# Altium footprint library 28Pins_Project_V1I1.PcbLib: 30 footprints (part 1 of 2)
Each footprint in its own frame and in the unit in brackets; x right, y up, seen from the top. Pads: shape width x height; smd on the part's side, far side on the other; paste and mask are expansions set on the pad; w line width, h text height; cw(c..) or ccw(c..) is an arc to the next point about the centre after c.
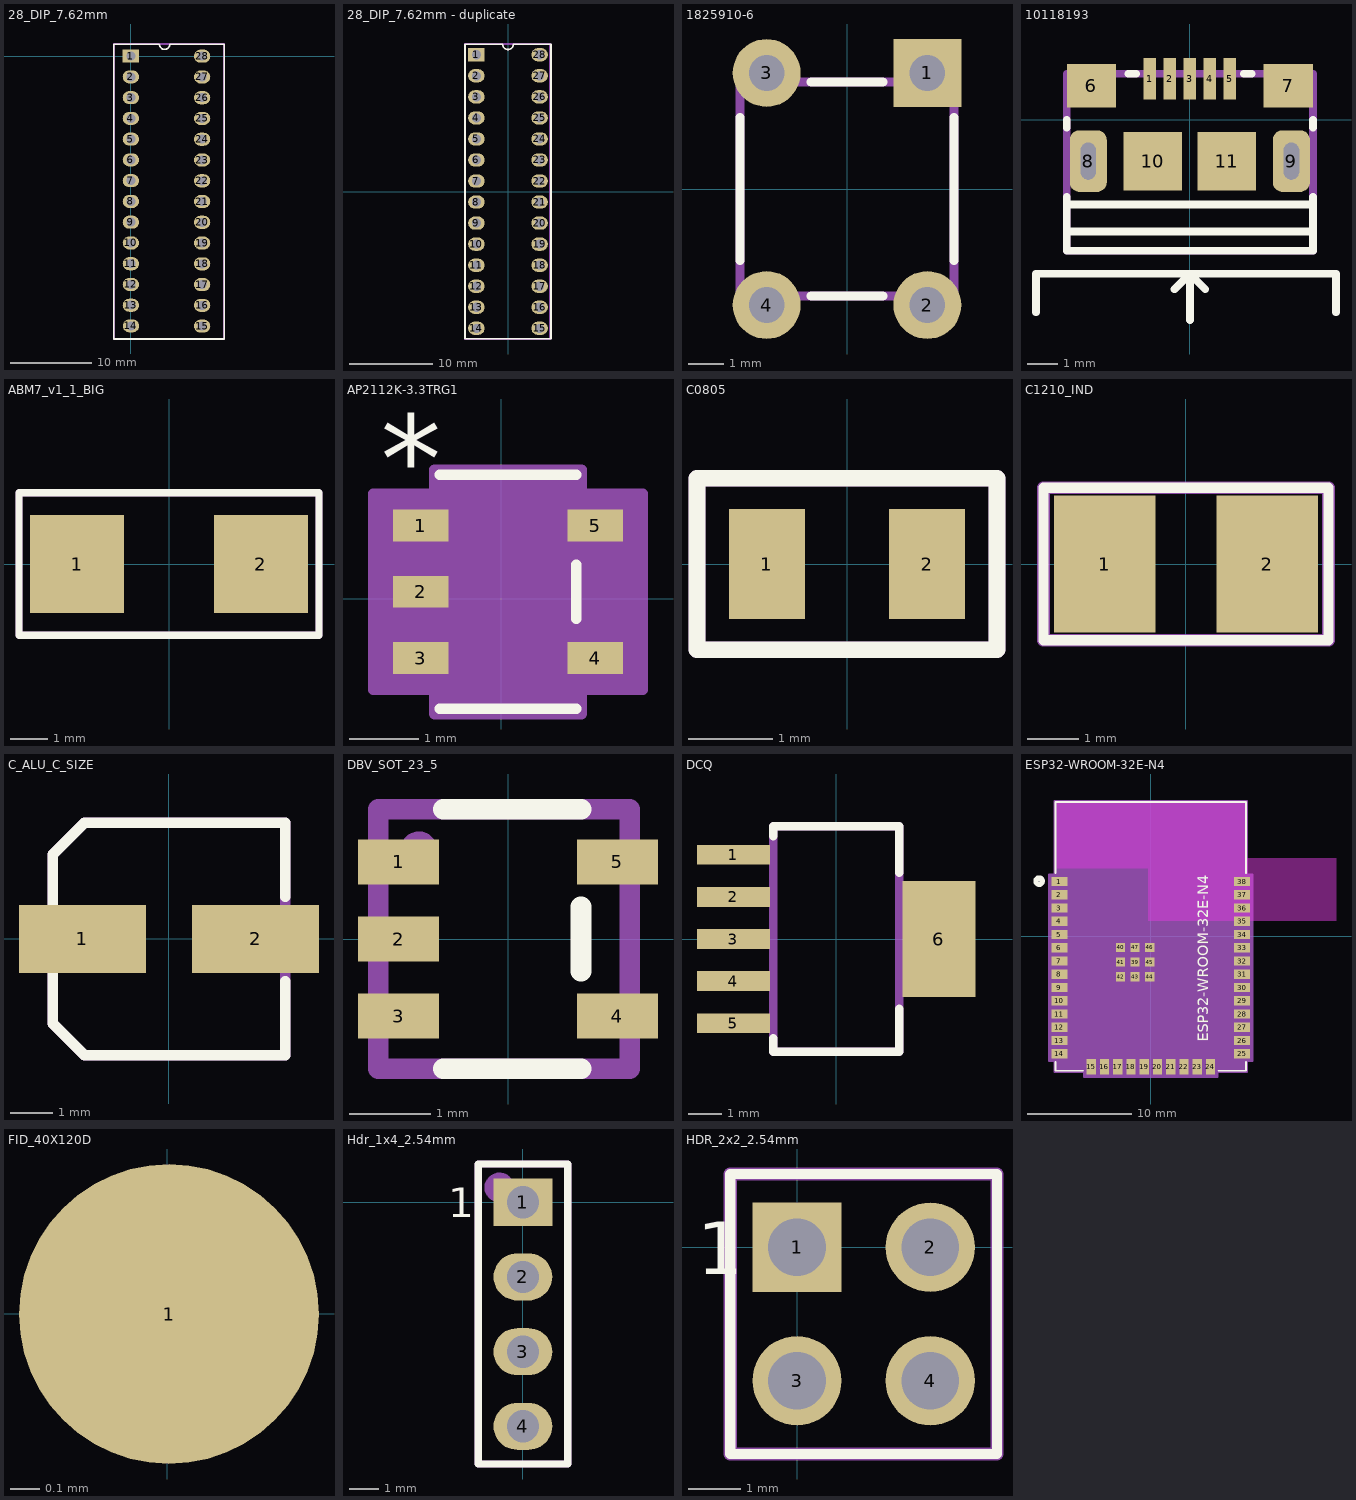
[diagram p0: the footprints below, top view; thin cyan lines are the x and y axes]

## 28_DIP_7.62mm [mm]
pads (28):
  rect 2x1.6 hole 1.1: 1(0,0)
  oval 2x1.6 hole 1.1: 2(0,-2.54) 3(0,-5.08) 4(0,-7.62) 5(0,-10.16) 6(0,-12.7) 7(0,-15.24) 8(0,-17.78) 9(0,-20.32) 10(0,-22.86) 11(0,-25.4) 12(0,-27.94) 13(0,-30.48) 14(0.01,-33.01) 15(8.71,-33.03) 16(8.71,-30.49) 17(8.71,-27.95) 18(8.71,-25.41) 19(8.71,-22.87) 20(8.71,-20.33) 21(8.71,-17.79) 22(8.71,-15.25) 23(8.71,-12.71) 24(8.71,-10.17) 25(8.71,-7.63) 26(8.71,-5.09) 27(8.71,-2.55) 28(8.71,-0.01)
Top Overlay:
  lines w0.2: -2.09,-34.608 -2.09,1.46 3.485,1.46 ccw(c4.12,1.46) 4.755,1.46 11.41,1.46 11.41,-34.608 -2.09,-34.608
Mechanical 29:
  circle w0.6: c-0.09,-0.11 r0.316
  lines w0.254: -2.09,-34.61 11.41,-34.61 11.41,1.49 -2.09,1.49 -2.09,-34.61
  text ".Designator" at 4.548,-21.656 h1.52
3D body "atmega328p-pu.stp": height 4.5, standoff -2.8, extent -0.328,-33.91 9.348,0.69

## 28_DIP_7.62mm - duplicate [mm]
pads (28):
  rect 2x1.6 hole 1.1: 1(-3.81,16.51)
  oval 2x1.6 hole 1.1: 2(-3.81,13.97) 3(-3.81,11.43) 4(-3.81,8.89) 5(-3.81,6.35) 6(-3.81,3.81) 7(-3.81,1.27) 8(-3.81,-1.27) 9(-3.81,-3.81) 10(-3.81,-6.35) 11(-3.81,-8.89) 12(-3.81,-11.43) 13(-3.81,-13.97) 14(-3.81,-16.51) 15(3.81,-16.51) 16(3.81,-13.97) 17(3.81,-11.43) 18(3.81,-8.89) 19(3.81,-6.35) 20(3.81,-3.81) 21(3.81,-1.27) 22(3.81,1.27) 23(3.81,3.81) 24(3.81,6.35) 25(3.81,8.89) 26(3.81,11.43) 27(3.81,13.97) 28(3.81,16.51)
Top Overlay:
  lines w0.2: -5.2,-17.78 -5.2,17.78 -0.635,17.78 ccw(c0,17.78) 0.635,17.78 5.2,17.78 5.2,-17.78 -5.2,-17.78
Mechanical 29:
  circle w0.6: c-3.9,16.5 r0.2
  lines w0.254: -5.2,-17.8 -5.2,17.8 5.1,17.8 5.1,-17.8 -5.2,-17.8
  text ".Designator" at 0.338,-8.246 h1.52
3D body "User Library-DIP28.STEP": height 9.07, standoff 0.69, extent -3.81,-17.5 4.01,17.55

## 28_DIP_7.62mm_SOCKET [mm]
3D body "dil_socket.stp": height 4.2, standoff -3.17, extent -1.24,-34.26 8.86,1.24

## 1825910-6 [mm]
pads (4):
  rect 1.9x1.9 hole 1: 1(2.25,3.25)
  round 1.9 hole 1: 2(2.25,-3.25) 3(-2.25,3.25) 4(-2.25,-3.25)
Top Overlay:
  lines w0.254: -3,-2 -3,2 ; -1,-3 1,-3 ; -1,3 1,3 ; 3,-2 3,2
Mechanical 29:
  lines w0.254: -3,-3 -3,3 3,3 3,-3 -3,-3
  text ".Designator" at -1.746,-0.238 h1.52
3D body "User Library-FSM4JLH(1825910-5).step": height 5.01, standoff -3.5, extent -2.995,-3.9 2.995,3.9

## 10118193 [mm]
pads (11):
  rect 0.4x1.35 smd: 1(-1.3,1.338) 2(-0.65,1.338) 3(0,1.338) 4(0.65,1.338) 5(1.3,1.338)
  rect 1.6x1.4 smd: 6(-3.2,1.112) 7(3.2,1.112)
  rrect50% 1.2x2 hole 0.5 slot 1.2 at 90 deg: 8(-3.3,-1.338) 9(3.3,-1.338)
  rect 1.9x1.9 smd: 10(-1.2,-1.338) 11(1.2,-1.338)
Top Overlay:
  lines w0.254: -5,-6.25 -5,-5 4.75,-5 4.75,-6.25 ; -4,-3.625 4,-3.625 ; -4,-2.75 4,-2.75 ; -4,-2.5 -4,-4.25 4,-4.25 4,-2.5 ; -4,-0.25 -4,0 ; -2,1.5 -1.75,1.5 ; -0.5,-5.5 -0.125,-5.125 -0.125,-5 ; 0,-6.5 0,-5 0.5,-5.5 ; 1.75,1.5 2,1.5 ; 4,-0.25 4,0
Mechanical 29:
  lines w0.254: -4,-4.25 4,-4.25 4,1.5 -4,1.5 -4,-4.25
  text ".Designator" at -1.496,-1.238 h1.52
3D body "10118193-0001lfc.stp": height 2.71, standoff -0.89, extent -3.928,-4.161 3.928,1.5

## ABM7_v1_1_BIG [mm]
pads (2):
  rect 2.5x2.6 smd: 1(-2.45,0) 2(2.45,0)
Top Overlay:
  lines w0.2: -4,-1.9 -4,1.9 4,1.9 4,-1.9 -4,-1.9
Mechanical 29:
  lines w0.2: -4,-1.9 4,-1.9 4,1.9 -4,1.9 -4,-1.9
  text ".Designator" at -2.5,-1.233 h0.5
3D body "User Library-ABM7.step": height 1.45, standoff 0.01, extent -3.05,-1.75 3.05,1.75

## AP2112K-3.3TRG1 [mil]
pads (5):
  rect 31.5x18 smd paste+0 mask+0: 1(-45.31,41.34) 2(-45.31,3.94) 3(-45.31,-33.46) 4(53.19,-33.46) 5(53.19,41.34)
Top Overlay:
  lines w6: -34.56,-62.06 42.44,-62.06 ; -34.56,69.94 42.44,69.94 ; 42.44,-11.36 42.44,19.24
  text "*" at -67.81,54.34 h50
Mechanical 13:
  lines w0: -8.06,64.94 ccw(c3.94,64.94) 15.94,64.94
  lines w1: -55.06,-43.46 -55.06,-23.46 -29.56,-23.46 -29.56,-43.46 -55.06,-43.46 ; -55.06,-6.06 -55.06,13.94 -29.56,13.94 -29.56,-6.06 -55.06,-6.06 ; -55.06,31.34 -55.06,51.34 -29.56,51.34 -29.56,31.34 -55.06,31.34 ; -29.56,-57.06 37.44,-57.06 37.44,64.94 -29.56,64.94 -29.56,-57.06 ; 37.44,-43.46 37.44,-23.46 62.94,-23.46 62.94,-43.46 37.44,-43.46 ; 37.44,31.34 37.44,51.34 62.94,51.34 62.94,31.34 37.44,31.34
  text "*" at -32.06,11.34 h50
  text "RefDes2" at -83.56,-21.06 h50
Mechanical 15:
  region: 45.44,-65.06 -37.56,-65.06 -37.56,-51.46 -72.06,-51.46 -72.06,59.34 -37.56,59.34 -37.56,72.94 45.44,72.94 45.44,59.34 79.94,59.34 79.94,-51.46 45.44,-51.46
  lines w6: -72.06,-51.46 -37.56,-51.46 -37.56,-65.06 45.44,-65.06 45.44,-51.46 79.94,-51.46 79.94,59.34 45.44,59.34 45.44,72.94 -37.56,72.94 -37.56,59.34 -72.06,59.34 -72.06,-51.46
3D body "SOT_RG1_DIO.step": height 51.1, standoff 0, extent -55.08,-57.05 62.95,64.92

## C0805 [mm]
pads (2):
  rect 0.9x1.3 smd: 1(-0.95,0) 2(0.95,0)
Top Overlay:
  lines w0.2: -1.778,-1.016 -1.778,1.016 1.778,1.016 1.778,-1.016 -1.778,-1.016
Mechanical 29:
  lines w0.2: -1.778,-1.016 -1.778,1.016 1.778,1.016 1.778,-1.016 -1.778,-1.016
  text ".Designator" at -1.224,-0.839 h0.25
3D body "User Library-Chip Capacitor2.step": height 0.81, standoff 0.01, extent -0.8,-0.46 0.8,0.4
3D body "User Library-Chip Capacitor2.step": height 1.26, standoff 0.46, extent -0.8,-0.46 0.8,0.4

## C1210_IND [mm]
pads (2):
  rect 2x2.7 smd: 1(-1.6,0) 2(1.6,0)
Top Overlay:
  lines w0.2: -2.8,-1.5 2.8,-1.5 2.8,1.5 -2.8,1.5 -2.8,-1.5
Mechanical 29:
  lines w0.254: -2.8,-1.5 -2.8,1.5 2.8,1.5 2.8,-1.5 -2.8,-1.5
  text ".Designator" at -2,-0.417 h1.15
3D body: height 2.7, standoff -0.01, extent -1.85,-1.25 -1.35,1.25
3D body: height 2.7, standoff -0.01, extent 1.35,-1.25 1.85,1.25
3D body: height 2.7, standoff -0.01, extent -1.446,-1.3 1.4,1.3

## C_ALU_C_SIZE [mm]
pads (2):
  rect 3x1.6 smd: 1(-2.05,0) 2(2.05,0)
Top Overlay:
  lines w0.254: -2.75,-1 -2.75,-2 ; -2.75,1 -2.75,2 ; 2.75,-1 2.75,-2.75 -2,-2.75 -2.75,-2 ; 2.75,1 2.75,2.75 -2,2.75 -2.75,2 ; -2.75,-2 -2.75,2
Mechanical 29:
  lines w0.254: -2.75,-2 -2,-2.75 2.75,-2.75 2.75,2.75 -2,2.75 -2.75,2 -2.75,-2
  text ".Designator" at -1.55,-1.467 h1
3D body "User Library-capacitor size C.step": height 5.42, standoff 0.01, extent -2.95,-2.65 2.95,2.65

## DBV_SOT_23_5 [mm]
pads (5):
  rect 1x0.55 smd: 1(-1.35,0.95) 2(-1.35,0) 3(-1.35,-0.95) 4(1.35,-0.95) 5(1.35,0.95)
Top Overlay:
  lines w0.254: -0.8,-1.6 0.9,-1.6 ; -0.8,1.6 0.9,1.6 ; 0.9,-0.4 0.9,0.4
Mechanical 29:
  circle w0.254: c-1.1,1.1 r0.1
  lines w0.254: -1.6,-1.6 -1.6,1.6 1.5,1.6 1.5,-1.6 -1.6,-1.6
  text ".Designator" at -1.25,-1.317 h0.4
3D body "User Library-TPS560200DBV.step": height 1.45, standoff 0, extent -1.514,-1.5 1.514,1.5

## DCQ [mm]
pads (6):
  rect 2.2x0.6 smd: 1(-3.1,2.54) 2(-3.1,1.27) 3(-3.1,0) 4(-3.1,-1.27) 5(-3.1,-2.54)
  rect 2.2x3.5 smd: 6(3.1,0)
Top Overlay:
  lines w0.254: -1.9,-3 -1.9,-3.4 1.9,-3.4 1.9,-2.1 ; -1.9,3.1 -1.9,3.4 1.9,3.4 1.9,2
Mechanical 29:
  lines w0.254: -1.9,-3.4 -1.9,3.4 1.9,3.4 1.9,-3.4 -1.9,-3.4
  text ".Designator" at 0.467,-2.5 h1
3D body "User Library-TPS73701DCQ.step": height 1.8, standoff 0, extent -3.63,-3.275 3.63,3.275

## ESP32-WROOM-32E-N4 [mil]
pads (47):
  rect 59x35 smd paste+0 mask+0: 1(-344.5,207.1) 2(-344.5,157.1) 3(-344.5,107.1) 4(-344.5,57.1) 5(-344.5,7.1) 6(-344.5,-42.9) 7(-344.5,-92.9) 8(-344.5,-142.9) 9(-344.5,-192.9) 10(-344.5,-242.9) 11(-344.5,-292.9) 12(-344.5,-342.9) 13(-344.5,-392.9) 14(-344.5,-442.9) 25(344.5,-442.9) 26(344.5,-392.9) 27(344.5,-342.9) 28(344.5,-292.9) 29(344.5,-242.9) 30(344.5,-192.9) 31(344.5,-142.9) 32(344.5,-92.9) 33(344.5,-42.9) 34(344.5,7.1) 35(344.5,57.1) 36(344.5,107.1) 37(344.5,157.1) 38(344.5,207.1)
  rect 35x59 smd paste+0 mask+0: 15(-225,-492.15) 16(-175,-492.15) 17(-125,-492.15) 18(-75,-492.15) 19(-25,-492.15) 20(25,-492.15) 21(75,-492.15) 22(125,-492.15) 23(175,-492.15) 24(225,-492.15)
  rect 35x35 smd paste+0 mask+0: 39(-59.1,-96.9) 40(-114.2,-41.8) 41(-114.2,-96.9) 42(-114.2,-152) 43(-59.1,-152) 44(-4,-152) 45(-4,-96.9) 46(-4,-41.8) 47(-59.1,-41.8)
Top Overlay:
  circle w19.68: c-421.26,208.66 r11.81
  lines w6: -359.5,-473.5 -359.5,-507 -255.6,-507 ; -359.5,237.7 -359.5,507 359.5,507 359.5,237.7 ; 255.6,-507 359.5,-507 359.5,-473.5
  text "ESP32-WROOM-32E-N4" at 216.54,-397.64 h39.37
Keep-Out Layer:
  region: 699,294.75 -10,294.75 -10,58.75 699,58.75
  region: 354.5,258 354.5,502 -354.5,502 -354.5,258
Mechanical 13:
  lines w1: -354.5,-502 354.5,-502 354.5,502 -354.5,502 -354.5,-502
  text "*" at -302.5,182.1 h50
  text "RefDes2" at -87.5,-25 h50
Mechanical 15:
  region: -364.5,-512 -252.5,-512 -252.5,-531.65 252.5,-531.65 252.5,-512 364.5,-512 364.5,-470.4 384,-470.4 384,234.6 364.5,234.6 364.5,512 -364.5,512 -364.5,234.6 -384,234.6 -384,-470.4 -364.5,-470.4
  lines w6: -384,-470.4 -384,234.6 -364.5,234.6 -364.5,512 364.5,512 364.5,234.6 384,234.6 384,-470.4 364.5,-470.4 364.5,-512 252.5,-512 252.5,-531.65 -252.5,-531.65 -252.5,-512 -364.5,-512 -364.5,-470.4 -384,-470.4
3D body "User Library-ESP32-WROOM.step": height 114.37, standoff -0.28, extent -354.33,-501.97 354.33,501.97

## FID_40X120D [mil]
pads (1):
  round 40 smd paste-40 mask+40: 1(0.21,-0.03)

## Hdr_1x4_2.54mm [mm]
pads (4):
  rect 2x1.6 hole 1.1: 1(0,0)
  oval 2x1.6 hole 1.1: 2(0,-2.54) 3(0,-5.08) 4(0,-7.62)
Top Overlay:
  lines w0.254: -1.524,-8.9 1.524,-8.9 1.524,1.3 -1.524,1.3 -1.524,-8.9
  text "1" at -2.54,-0.508 h1
Mechanical 29:
  circle w0.508: c-0.8,0.5 r0.254
  lines w0.254: -1.524,-8.9 1.524,-8.9 1.524,1.3 -1.524,1.3 -1.524,-8.9
  text ".Designator" at 0.907,-8.146 h1.02
3D body "HDR_1x4_White.stp": height 8.19, standoff -3.31, extent -1.3,-8.7 1.11,1.06

## HDR_2x2_2.54mm [mm]
pads (4):
  rect 1.7x1.7 hole 1.1: 1(0,0)
  round 1.7 hole 1.1: 2(2.54,0) 3(0,-2.54) 4(2.54,-2.54)
Top Overlay:
  lines w0.2: -1.27,-3.937 3.81,-3.937 3.81,1.397 -1.27,1.397 -1.27,-3.937
  text "1" at -1.905,-0.508 h1
Mechanical 29:
  circle w0.508: c0,0 r0.284
  lines w0.254: -1.27,-3.937 -1.27,1.397 3.81,1.397 3.81,-3.937 -1.27,-3.937
  text ".Designator" at 1.143,-2.54 h0.76
3D body "User Library-STRIPM02x02.STEP": height 8.51, standoff -2.99, extent -1.27,-3.683 3.81,1.397